# Altium schematic symbol library jlcpcb_2025_04_resistors_extended_1210.schlib: 2670 symbols (part 9 of 14) (continued)
## ESR25JZPF82R0 (continued)
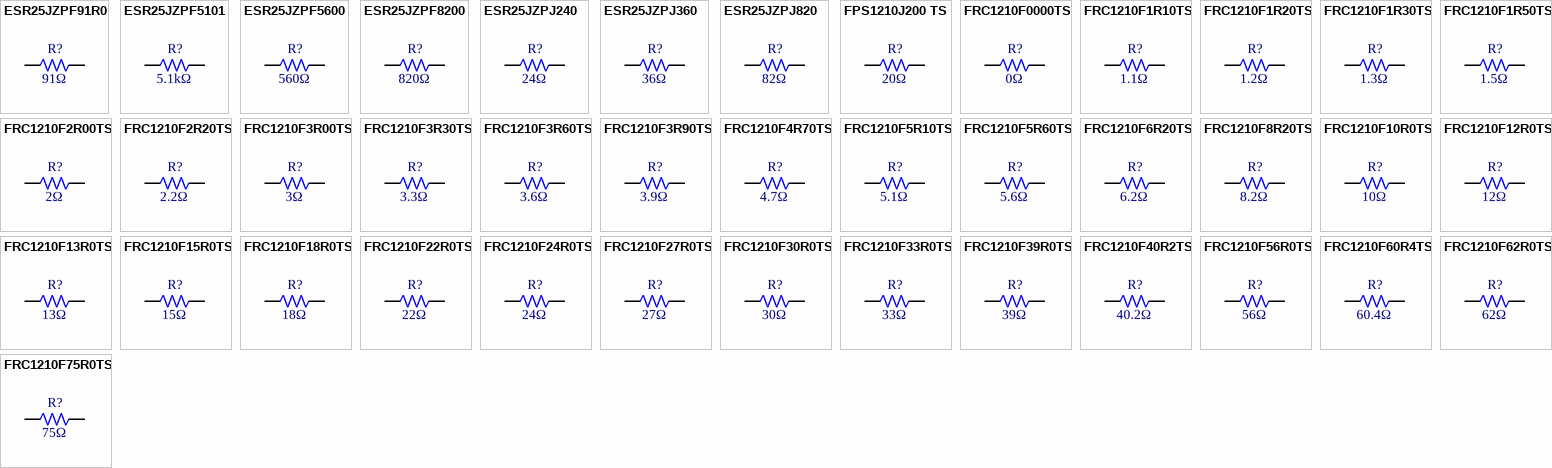
[diagram p40: symbols ESR25JZPF91R0 to FRC1210F75R0TS]

## ESR25JZPF91R0
designator R?  Resistance: 91Ω  (hidden comment: *)
Resistor, 91Ω, ±1%, 660mW, 200V, ±100ppm/℃, -55℃~+155℃, SMD 1210; Manufacturer: Uniroyal; Manufacturer Part Number: ESR25JZPF91R0; Supplier 1: LCSC; Supplier Part Number 1: C307931; JLCPCB Part Number: C307931; Power Rating: 660mW; Category: Resistors; Package Size: 1210; JLCPCB Basic Part: Yes; Tolerance: ±1%; Voltage Rating: 200V; Temperature Coefficient: ±100ppm/℃; Temperature Rating: -55℃~+155℃; ComponentLink1Description: Datasheet; ComponentLink1URL: https://wmsc.lcsc.com/wmsc/upload/file/pdf/v2/lcsc/1810171830_ROHM-Semicon-ESR25JZPF91R0_C307931.pdf; ComponentLink2Description: JLCPCB Part URL; ComponentLink2URL: https://jlcpcb.com/partdetail/C307931
pins: 1, 2
1 alternate drawing of the same symbol

## ESR25JZPF5101
designator R?  Resistance: 5.1kΩ  (hidden comment: *)
Resistor, 5.1kΩ, ±1%, 660mW, 200V, ±100ppm/℃, -55℃~+155℃, SMD 1210; Manufacturer: Uniroyal; Manufacturer Part Number: ESR25JZPF5101; Supplier 1: LCSC; Supplier Part Number 1: C307928; JLCPCB Part Number: C307928; Power Rating: 660mW; Category: Resistors; Package Size: 1210; JLCPCB Basic Part: Yes; Tolerance: ±1%; Voltage Rating: 200V; Temperature Coefficient: ±100ppm/℃; Temperature Rating: -55℃~+155℃; ComponentLink1Description: Datasheet; ComponentLink1URL: https://wmsc.lcsc.com/wmsc/upload/file/pdf/v2/lcsc/1811021935_ROHM-Semicon-ESR25JZPF5101_C307928.pdf; ComponentLink2Description: JLCPCB Part URL; ComponentLink2URL: https://jlcpcb.com/partdetail/C307928
pins: 1, 2
1 alternate drawing of the same symbol

## ESR25JZPF5600
designator R?  Resistance: 560Ω  (hidden comment: *)
Resistor, 560Ω, ±1%, 660mW, 200V, ±100ppm/℃, -55℃~+155℃, SMD 1210; Manufacturer: Uniroyal; Manufacturer Part Number: ESR25JZPF5600; Supplier 1: LCSC; Supplier Part Number 1: C307929; JLCPCB Part Number: C307929; Power Rating: 660mW; Category: Resistors; Package Size: 1210; JLCPCB Basic Part: Yes; Tolerance: ±1%; Voltage Rating: 200V; Temperature Coefficient: ±100ppm/℃; Temperature Rating: -55℃~+155℃; ComponentLink1Description: Datasheet; ComponentLink1URL: https://wmsc.lcsc.com/wmsc/upload/file/pdf/v2/lcsc/1811061027_ROHM-Semicon-ESR25JZPF5600_C307929.pdf; ComponentLink2Description: JLCPCB Part URL; ComponentLink2URL: https://jlcpcb.com/partdetail/C307929
pins: 1, 2
1 alternate drawing of the same symbol

## ESR25JZPF8200
designator R?  Resistance: 820Ω  (hidden comment: *)
Resistor, 820Ω, ±1%, 660mW, 200V, ±100ppm/℃, -55℃~+155℃, SMD 1210; Manufacturer: Uniroyal; Manufacturer Part Number: ESR25JZPF8200; Supplier 1: LCSC; Supplier Part Number 1: C307930; JLCPCB Part Number: C307930; Power Rating: 660mW; Category: Resistors; Package Size: 1210; JLCPCB Basic Part: Yes; Tolerance: ±1%; Voltage Rating: 200V; Temperature Coefficient: ±100ppm/℃; Temperature Rating: -55℃~+155℃; ComponentLink1Description: Datasheet; ComponentLink1URL: https://wmsc.lcsc.com/wmsc/upload/file/pdf/v2/lcsc/1811141835_ROHM-Semicon-ESR25JZPF8200_C307930.pdf; ComponentLink2Description: JLCPCB Part URL; ComponentLink2URL: https://jlcpcb.com/partdetail/C307930
pins: 1, 2
1 alternate drawing of the same symbol

## ESR25JZPJ240
designator R?  Resistance: 24Ω  (hidden comment: *)
Resistor, 24Ω, ±5%, 666.667mW, 200V, ±200ppm/℃, -55℃~+155℃, SMD 1210; Manufacturer: Uniroyal; Manufacturer Part Number: ESR25JZPJ240; Supplier 1: LCSC; Supplier Part Number 1: C307935; JLCPCB Part Number: C307935; Power Rating: 666.667mW; Category: Resistors; Package Size: 1210; JLCPCB Basic Part: Yes; Tolerance: ±5%; Voltage Rating: 200V; Temperature Coefficient: ±200ppm/℃; Temperature Rating: -55℃~+155℃; ComponentLink1Description: Datasheet; ComponentLink1URL: https://wmsc.lcsc.com/wmsc/upload/file/pdf/v2/lcsc/1912111437_ROHM-Semicon-ESR25JZPJ240_C307935.pdf; ComponentLink2Description: JLCPCB Part URL; ComponentLink2URL: https://jlcpcb.com/partdetail/C307935
pins: 1, 2
1 alternate drawing of the same symbol

## ESR25JZPJ360
designator R?  Resistance: 36Ω  (hidden comment: *)
Resistor, 36Ω, ±5%, 660mW, 200V, ±200ppm/℃, -55℃~+155℃, SMD 1210; Manufacturer: Uniroyal; Manufacturer Part Number: ESR25JZPJ360; Supplier 1: LCSC; Supplier Part Number 1: C307938; JLCPCB Part Number: C307938; Power Rating: 660mW; Category: Resistors; Package Size: 1210; JLCPCB Basic Part: Yes; Tolerance: ±5%; Voltage Rating: 200V; Temperature Coefficient: ±200ppm/℃; Temperature Rating: -55℃~+155℃; ComponentLink1Description: Datasheet; ComponentLink1URL: https://wmsc.lcsc.com/wmsc/upload/file/pdf/v2/lcsc/1912111437_ROHM-Semicon-ESR25JZPJ360_C307938.pdf; ComponentLink2Description: JLCPCB Part URL; ComponentLink2URL: https://jlcpcb.com/partdetail/C307938
pins: 1, 2
1 alternate drawing of the same symbol

## ESR25JZPJ820
designator R?  Resistance: 82Ω  (hidden comment: *)
Resistor, 82Ω, ±5%, 660mW, 200V, ±200ppm/℃, -55℃~+155℃, SMD 1210; Manufacturer: Uniroyal; Manufacturer Part Number: ESR25JZPJ820; Supplier 1: LCSC; Supplier Part Number 1: C307941; JLCPCB Part Number: C307941; Power Rating: 660mW; Category: Resistors; Package Size: 1210; JLCPCB Basic Part: Yes; Tolerance: ±5%; Voltage Rating: 200V; Temperature Coefficient: ±200ppm/℃; Temperature Rating: -55℃~+155℃; ComponentLink1Description: Datasheet; ComponentLink1URL: https://wmsc.lcsc.com/wmsc/upload/file/pdf/v2/lcsc/1912111437_ROHM-Semicon-ESR25JZPJ820_C307941.pdf; ComponentLink2Description: JLCPCB Part URL; ComponentLink2URL: https://jlcpcb.com/partdetail/C307941
pins: 1, 2
1 alternate drawing of the same symbol

## FPS1210J200 TS
designator R?  Resistance: 20Ω  (hidden comment: *)
Resistor, 20Ω, ±5%, ±200ppm/℃, SMD 1210; Manufacturer: Uniroyal; Manufacturer Part Number: FPS1210J200 TS; Supplier 1: LCSC; Supplier Part Number 1: C3013392; JLCPCB Part Number: C3013392; Category: Resistors; Package Size: 1210; JLCPCB Basic Part: Yes; Tolerance: ±5%; Temperature Coefficient: ±200ppm/℃; ComponentLink1Description: Datasheet; ComponentLink1URL: https://wmsc.lcsc.com/wmsc/upload/file/pdf/v2/lcsc/2308241947_FOJAN-FPS1210J200-TS_C3013392.pdf; ComponentLink2Description: JLCPCB Part URL; ComponentLink2URL: https://jlcpcb.com/partdetail/C3013392
pins: 1, 2
1 alternate drawing of the same symbol

## FRC1210F0000TS
designator R?  Resistance: 0Ω  (hidden comment: *)
Resistor, 0Ω, ±1%, 333.333mW, 200V, ±200ppm/℃, -55℃~+155℃, SMD 1210; Manufacturer: Uniroyal; Manufacturer Part Number: FRC1210F0000TS; Supplier 1: LCSC; Supplier Part Number 1: C2974058; JLCPCB Part Number: C2974058; Power Rating: 333.333mW; Category: Resistors; Package Size: 1210; JLCPCB Basic Part: Yes; Tolerance: ±1%; Voltage Rating: 200V; Temperature Coefficient: ±200ppm/℃; Temperature Rating: -55℃~+155℃; ComponentLink1Description: Datasheet; ComponentLink1URL: https://wmsc.lcsc.com/wmsc/upload/file/pdf/v2/lcsc/2202151130_FOJAN-FRC1210F0000TS_C2974058.pdf; ComponentLink2Description: JLCPCB Part URL; ComponentLink2URL: https://jlcpcb.com/partdetail/C2974058
pins: 1, 2
1 alternate drawing of the same symbol

## FRC1210F1R10TS
designator R?  Resistance: 1.1Ω  (hidden comment: *)
Resistor, 1.1Ω, ±1%, 333.333mW, 200V, ±200ppm/℃, -55℃~+155℃, SMD 1210; Manufacturer: Uniroyal; Manufacturer Part Number: FRC1210F1R10TS; Supplier 1: LCSC; Supplier Part Number 1: C2933808; JLCPCB Part Number: C2933808; Power Rating: 333.333mW; Category: Resistors; Package Size: 1210; JLCPCB Basic Part: Yes; Tolerance: ±1%; Voltage Rating: 200V; Temperature Coefficient: ±200ppm/℃; Temperature Rating: -55℃~+155℃; ComponentLink1Description: Datasheet; ComponentLink1URL: https://wmsc.lcsc.com/wmsc/upload/file/pdf/v2/lcsc/2308241115_FOJAN-FRC1210F1R10TS_C2933808.pdf; ComponentLink2Description: JLCPCB Part URL; ComponentLink2URL: https://jlcpcb.com/partdetail/C2933808
pins: 1, 2
1 alternate drawing of the same symbol

## FRC1210F1R20TS
designator R?  Resistance: 1.2Ω  (hidden comment: *)
Resistor, 1.2Ω, ±1%, 333.333mW, 200V, ±200ppm/℃, -55℃~+155℃, SMD 1210; Manufacturer: Uniroyal; Manufacturer Part Number: FRC1210F1R20TS; Supplier 1: LCSC; Supplier Part Number 1: C2933809; JLCPCB Part Number: C2933809; Power Rating: 333.333mW; Category: Resistors; Package Size: 1210; JLCPCB Basic Part: Yes; Tolerance: ±1%; Voltage Rating: 200V; Temperature Coefficient: ±200ppm/℃; Temperature Rating: -55℃~+155℃; ComponentLink1Description: Datasheet; ComponentLink1URL: https://wmsc.lcsc.com/wmsc/upload/file/pdf/v2/lcsc/2308241115_FOJAN-FRC1210F1R20TS_C2933809.pdf; ComponentLink2Description: JLCPCB Part URL; ComponentLink2URL: https://jlcpcb.com/partdetail/C2933809
pins: 1, 2
1 alternate drawing of the same symbol

## FRC1210F1R30TS
designator R?  Resistance: 1.3Ω  (hidden comment: *)
Resistor, 1.3Ω, ±1%, 333.333mW, 200V, ±200ppm/℃, -55℃~+155℃, SMD 1210; Manufacturer: Uniroyal; Manufacturer Part Number: FRC1210F1R30TS; Supplier 1: LCSC; Supplier Part Number 1: C2960823; JLCPCB Part Number: C2960823; Power Rating: 333.333mW; Category: Resistors; Package Size: 1210; JLCPCB Basic Part: Yes; Tolerance: ±1%; Voltage Rating: 200V; Temperature Coefficient: ±200ppm/℃; Temperature Rating: -55℃~+155℃; ComponentLink1Description: Datasheet; ComponentLink1URL: https://wmsc.lcsc.com/wmsc/upload/file/pdf/v2/lcsc/2308241947_FOJAN-FRC1210F1R30TS_C2960823.pdf; ComponentLink2Description: JLCPCB Part URL; ComponentLink2URL: https://jlcpcb.com/partdetail/C2960823
pins: 1, 2
1 alternate drawing of the same symbol

## FRC1210F1R50TS
designator R?  Resistance: 1.5Ω  (hidden comment: *)
Resistor, 1.5Ω, ±1%, 500mW, 200V, ±200ppm/℃, -55℃~+155℃, SMD 1210; Manufacturer: Uniroyal; Manufacturer Part Number: FRC1210F1R50TS; Supplier 1: LCSC; Supplier Part Number 1: C2960845; JLCPCB Part Number: C2960845; Power Rating: 500mW; Category: Resistors; Package Size: 1210; JLCPCB Basic Part: Yes; Tolerance: ±1%; Voltage Rating: 200V; Temperature Coefficient: ±200ppm/℃; Temperature Rating: -55℃~+155℃; ComponentLink1Description: Datasheet; ComponentLink1URL: https://wmsc.lcsc.com/wmsc/upload/file/pdf/v2/lcsc/2308241947_FOJAN-FRC1210F1R50TS_C2960845.pdf; ComponentLink2Description: JLCPCB Part URL; ComponentLink2URL: https://jlcpcb.com/partdetail/C2960845
pins: 1, 2
1 alternate drawing of the same symbol

## FRC1210F2R00TS
designator R?  Resistance: 2Ω  (hidden comment: *)
Resistor, 2Ω, ±1%, 333.333mW, 200V, SMD 1210; Manufacturer: Uniroyal; Manufacturer Part Number: FRC1210F2R00TS; Supplier 1: LCSC; Supplier Part Number 1: C2999610; JLCPCB Part Number: C2999610; Power Rating: 333.333mW; Category: Resistors; Package Size: 1210; JLCPCB Basic Part: Yes; Tolerance: ±1%; Voltage Rating: 200V; ComponentLink1Description: Datasheet; ComponentLink1URL: https://wmsc.lcsc.com/wmsc/upload/file/pdf/v2/lcsc/2308241947_FOJAN-FRC1210F2R00TS_C2999610.pdf; ComponentLink2Description: JLCPCB Part URL; ComponentLink2URL: https://jlcpcb.com/partdetail/C2999610
pins: 1, 2
1 alternate drawing of the same symbol

## FRC1210F2R20TS
designator R?  Resistance: 2.2Ω  (hidden comment: *)
Resistor, 2.2Ω, ±1%, 333.333mW, 200V, ±200ppm/℃, SMD 1210; Manufacturer: Uniroyal; Manufacturer Part Number: FRC1210F2R20TS; Supplier 1: LCSC; Supplier Part Number 1: C3013277; JLCPCB Part Number: C3013277; Power Rating: 333.333mW; Category: Resistors; Package Size: 1210; JLCPCB Basic Part: Yes; Tolerance: ±1%; Voltage Rating: 200V; Temperature Coefficient: ±200ppm/℃; ComponentLink1Description: Datasheet; ComponentLink1URL: https://wmsc.lcsc.com/wmsc/upload/file/pdf/v2/lcsc/2308241947_FOJAN-FRC1210F2R20TS_C3013277.pdf; ComponentLink2Description: JLCPCB Part URL; ComponentLink2URL: https://jlcpcb.com/partdetail/C3013277
pins: 1, 2
1 alternate drawing of the same symbol

## FRC1210F3R00TS
designator R?  Resistance: 3Ω  (hidden comment: *)
Resistor, 3Ω, ±1%, 333.333mW, 200V, ±200ppm/℃, SMD 1210; Manufacturer: Uniroyal; Manufacturer Part Number: FRC1210F3R00TS; Supplier 1: LCSC; Supplier Part Number 1: C2999570; JLCPCB Part Number: C2999570; Power Rating: 333.333mW; Category: Resistors; Package Size: 1210; JLCPCB Basic Part: Yes; Tolerance: ±1%; Voltage Rating: 200V; Temperature Coefficient: ±200ppm/℃; ComponentLink1Description: Datasheet; ComponentLink1URL: https://wmsc.lcsc.com/wmsc/upload/file/pdf/v2/lcsc/2308241947_FOJAN-FRC1210F3R00TS_C2999570.pdf; ComponentLink2Description: JLCPCB Part URL; ComponentLink2URL: https://jlcpcb.com/partdetail/C2999570
pins: 1, 2
1 alternate drawing of the same symbol

## FRC1210F3R30TS
designator R?  Resistance: 3.3Ω  (hidden comment: *)
Resistor, 3.3Ω, ±1%, 333.333mW, 200V, ±200ppm/℃, SMD 1210; Manufacturer: Uniroyal; Manufacturer Part Number: FRC1210F3R30TS; Supplier 1: LCSC; Supplier Part Number 1: C2999568; JLCPCB Part Number: C2999568; Power Rating: 333.333mW; Category: Resistors; Package Size: 1210; JLCPCB Basic Part: Yes; Tolerance: ±1%; Voltage Rating: 200V; Temperature Coefficient: ±200ppm/℃; ComponentLink1Description: Datasheet; ComponentLink1URL: https://wmsc.lcsc.com/wmsc/upload/file/pdf/v2/lcsc/2308241947_FOJAN-FRC1210F3R30TS_C2999568.pdf; ComponentLink2Description: JLCPCB Part URL; ComponentLink2URL: https://jlcpcb.com/partdetail/C2999568
pins: 1, 2
1 alternate drawing of the same symbol

## FRC1210F3R60TS
designator R?  Resistance: 3.6Ω  (hidden comment: *)
Resistor, 3.6Ω, ±1%, 333.333mW, 200V, ±200ppm/℃, -55℃~+155℃, SMD 1210; Manufacturer: Uniroyal; Manufacturer Part Number: FRC1210F3R60TS; Supplier 1: LCSC; Supplier Part Number 1: C2933820; JLCPCB Part Number: C2933820; Power Rating: 333.333mW; Category: Resistors; Package Size: 1210; JLCPCB Basic Part: Yes; Tolerance: ±1%; Voltage Rating: 200V; Temperature Coefficient: ±200ppm/℃; Temperature Rating: -55℃~+155℃; ComponentLink1Description: Datasheet; ComponentLink1URL: https://wmsc.lcsc.com/wmsc/upload/file/pdf/v2/lcsc/2308241115_FOJAN-FRC1210F3R60TS_C2933820.pdf; ComponentLink2Description: JLCPCB Part URL; ComponentLink2URL: https://jlcpcb.com/partdetail/C2933820
pins: 1, 2
1 alternate drawing of the same symbol

## FRC1210F3R90TS
designator R?  Resistance: 3.9Ω  (hidden comment: *)
Resistor, 3.9Ω, ±1%, 333.333mW, 200V, ±200ppm/℃, SMD 1210; Manufacturer: Uniroyal; Manufacturer Part Number: FRC1210F3R90TS; Supplier 1: LCSC; Supplier Part Number 1: C3000655; JLCPCB Part Number: C3000655; Power Rating: 333.333mW; Category: Resistors; Package Size: 1210; JLCPCB Basic Part: Yes; Tolerance: ±1%; Voltage Rating: 200V; Temperature Coefficient: ±200ppm/℃; ComponentLink1Description: Datasheet; ComponentLink1URL: https://wmsc.lcsc.com/wmsc/upload/file/pdf/v2/lcsc/2308241947_FOJAN-FRC1210F3R90TS_C3000655.pdf; ComponentLink2Description: JLCPCB Part URL; ComponentLink2URL: https://jlcpcb.com/partdetail/C3000655
pins: 1, 2
1 alternate drawing of the same symbol

## FRC1210F4R70TS
designator R?  Resistance: 4.7Ω  (hidden comment: *)
Resistor, 4.7Ω, ±1%, 333.333mW, 200V, ±200ppm/℃, SMD 1210; Manufacturer: Uniroyal; Manufacturer Part Number: FRC1210F4R70TS; Supplier 1: LCSC; Supplier Part Number 1: C2999571; JLCPCB Part Number: C2999571; Power Rating: 333.333mW; Category: Resistors; Package Size: 1210; JLCPCB Basic Part: Yes; Tolerance: ±1%; Voltage Rating: 200V; Temperature Coefficient: ±200ppm/℃; ComponentLink1Description: Datasheet; ComponentLink1URL: https://wmsc.lcsc.com/wmsc/upload/file/pdf/v2/lcsc/2308241947_FOJAN-FRC1210F4R70TS_C2999571.pdf; ComponentLink2Description: JLCPCB Part URL; ComponentLink2URL: https://jlcpcb.com/partdetail/C2999571
pins: 1, 2
1 alternate drawing of the same symbol

## FRC1210F5R10TS
designator R?  Resistance: 5.1Ω  (hidden comment: *)
Resistor, 5.1Ω, ±1%, 333.333mW, 200V, ±200ppm/℃, -55℃~+155℃, SMD 1210; Manufacturer: Uniroyal; Manufacturer Part Number: FRC1210F5R10TS; Supplier 1: LCSC; Supplier Part Number 1: C2933823; JLCPCB Part Number: C2933823; Power Rating: 333.333mW; Category: Resistors; Package Size: 1210; JLCPCB Basic Part: Yes; Tolerance: ±1%; Voltage Rating: 200V; Temperature Coefficient: ±200ppm/℃; Temperature Rating: -55℃~+155℃; ComponentLink1Description: Datasheet; ComponentLink1URL: https://wmsc.lcsc.com/wmsc/upload/file/pdf/v2/lcsc/2308241115_FOJAN-FRC1210F5R10TS_C2933823.pdf; ComponentLink2Description: JLCPCB Part URL; ComponentLink2URL: https://jlcpcb.com/partdetail/C2933823
pins: 1, 2
1 alternate drawing of the same symbol

## FRC1210F5R60TS
designator R?  Resistance: 5.6Ω  (hidden comment: *)
Resistor, 5.6Ω, ±1%, 333.333mW, 200V, ±200ppm/℃, SMD 1210; Manufacturer: Uniroyal; Manufacturer Part Number: FRC1210F5R60TS; Supplier 1: LCSC; Supplier Part Number 1: C3013282; JLCPCB Part Number: C3013282; Power Rating: 333.333mW; Category: Resistors; Package Size: 1210; JLCPCB Basic Part: Yes; Tolerance: ±1%; Voltage Rating: 200V; Temperature Coefficient: ±200ppm/℃; ComponentLink1Description: Datasheet; ComponentLink1URL: https://wmsc.lcsc.com/wmsc/upload/file/pdf/v2/lcsc/2308241947_FOJAN-FRC1210F5R60TS_C3013282.pdf; ComponentLink2Description: JLCPCB Part URL; ComponentLink2URL: https://jlcpcb.com/partdetail/C3013282
pins: 1, 2
1 alternate drawing of the same symbol

## FRC1210F6R20TS
designator R?  Resistance: 6.2Ω  (hidden comment: *)
Resistor, 6.2Ω, ±1%, 333.333mW, 200V, ±200ppm/℃, SMD 1210; Manufacturer: Uniroyal; Manufacturer Part Number: FRC1210F6R20TS; Supplier 1: LCSC; Supplier Part Number 1: C2999575; JLCPCB Part Number: C2999575; Power Rating: 333.333mW; Category: Resistors; Package Size: 1210; JLCPCB Basic Part: Yes; Tolerance: ±1%; Voltage Rating: 200V; Temperature Coefficient: ±200ppm/℃; ComponentLink1Description: Datasheet; ComponentLink1URL: https://wmsc.lcsc.com/wmsc/upload/file/pdf/v2/lcsc/2308241947_FOJAN-FRC1210F6R20TS_C2999575.pdf; ComponentLink2Description: JLCPCB Part URL; ComponentLink2URL: https://jlcpcb.com/partdetail/C2999575
pins: 1, 2
1 alternate drawing of the same symbol

## FRC1210F8R20TS
designator R?  Resistance: 8.2Ω  (hidden comment: *)
Resistor, 8.2Ω, ±1%, 333.333mW, 200V, ±200ppm/℃, -55℃~+155℃, SMD 1210; Manufacturer: Uniroyal; Manufacturer Part Number: FRC1210F8R20TS; Supplier 1: LCSC; Supplier Part Number 1: C2933825; JLCPCB Part Number: C2933825; Power Rating: 333.333mW; Category: Resistors; Package Size: 1210; JLCPCB Basic Part: Yes; Tolerance: ±1%; Voltage Rating: 200V; Temperature Coefficient: ±200ppm/℃; Temperature Rating: -55℃~+155℃; ComponentLink1Description: Datasheet; ComponentLink1URL: https://wmsc.lcsc.com/wmsc/upload/file/pdf/v2/lcsc/2308241115_FOJAN-FRC1210F8R20TS_C2933825.pdf; ComponentLink2Description: JLCPCB Part URL; ComponentLink2URL: https://jlcpcb.com/partdetail/C2933825
pins: 1, 2
1 alternate drawing of the same symbol

## FRC1210F10R0TS
designator R?  Resistance: 10Ω  (hidden comment: *)
Resistor, 10Ω, ±1%, 333.333mW, 200V, ±200ppm/℃, -55℃~+155℃, SMD 1210; Manufacturer: Uniroyal; Manufacturer Part Number: FRC1210F10R0TS; Supplier 1: LCSC; Supplier Part Number 1: C2974060; JLCPCB Part Number: C2974060; Power Rating: 333.333mW; Category: Resistors; Package Size: 1210; JLCPCB Basic Part: Yes; Tolerance: ±1%; Voltage Rating: 200V; Temperature Coefficient: ±200ppm/℃; Temperature Rating: -55℃~+155℃; ComponentLink1Description: Datasheet; ComponentLink1URL: https://wmsc.lcsc.com/wmsc/upload/file/pdf/v2/lcsc/2202151130_FOJAN-FRC1210F10R0TS_C2974060.pdf; ComponentLink2Description: JLCPCB Part URL; ComponentLink2URL: https://jlcpcb.com/partdetail/C2974060
pins: 1, 2
1 alternate drawing of the same symbol

## FRC1210F12R0TS
designator R?  Resistance: 12Ω  (hidden comment: *)
Resistor, 12Ω, ±1%, 333.333mW, 200V, ±100ppm/℃, -55℃~+155℃, SMD 1210; Manufacturer: Uniroyal; Manufacturer Part Number: FRC1210F12R0TS; Supplier 1: LCSC; Supplier Part Number 1: C2933802; JLCPCB Part Number: C2933802; Power Rating: 333.333mW; Category: Resistors; Package Size: 1210; JLCPCB Basic Part: Yes; Tolerance: ±1%; Voltage Rating: 200V; Temperature Coefficient: ±100ppm/℃; Temperature Rating: -55℃~+155℃; ComponentLink1Description: Datasheet; ComponentLink1URL: https://wmsc.lcsc.com/wmsc/upload/file/pdf/v2/lcsc/2308241115_FOJAN-FRC1210F12R0TS_C2933802.pdf; ComponentLink2Description: JLCPCB Part URL; ComponentLink2URL: https://jlcpcb.com/partdetail/C2933802
pins: 1, 2
1 alternate drawing of the same symbol

## FRC1210F13R0TS
designator R?  Resistance: 13Ω  (hidden comment: *)
Resistor, 13Ω, ±1%, 333.333mW, 200V, ±100ppm/℃, -55℃~+155℃, SMD 1210; Manufacturer: Uniroyal; Manufacturer Part Number: FRC1210F13R0TS; Supplier 1: LCSC; Supplier Part Number 1: C2933803; JLCPCB Part Number: C2933803; Power Rating: 333.333mW; Category: Resistors; Package Size: 1210; JLCPCB Basic Part: Yes; Tolerance: ±1%; Voltage Rating: 200V; Temperature Coefficient: ±100ppm/℃; Temperature Rating: -55℃~+155℃; ComponentLink1Description: Datasheet; ComponentLink1URL: https://wmsc.lcsc.com/wmsc/upload/file/pdf/v2/lcsc/2308241115_FOJAN-FRC1210F13R0TS_C2933803.pdf; ComponentLink2Description: JLCPCB Part URL; ComponentLink2URL: https://jlcpcb.com/partdetail/C2933803
pins: 1, 2
1 alternate drawing of the same symbol

## FRC1210F15R0TS
designator R?  Resistance: 15Ω  (hidden comment: *)
Resistor, 15Ω, ±1%, 333.333mW, 200V, ±100ppm/℃, -55℃~+155℃, SMD 1210; Manufacturer: Uniroyal; Manufacturer Part Number: FRC1210F15R0TS; Supplier 1: LCSC; Supplier Part Number 1: C2960857; JLCPCB Part Number: C2960857; Power Rating: 333.333mW; Category: Resistors; Package Size: 1210; JLCPCB Basic Part: Yes; Tolerance: ±1%; Voltage Rating: 200V; Temperature Coefficient: ±100ppm/℃; Temperature Rating: -55℃~+155℃; ComponentLink1Description: Datasheet; ComponentLink1URL: https://wmsc.lcsc.com/wmsc/upload/file/pdf/v2/lcsc/2308241947_FOJAN-FRC1210F15R0TS_C2960857.pdf; ComponentLink2Description: JLCPCB Part URL; ComponentLink2URL: https://jlcpcb.com/partdetail/C2960857
pins: 1, 2
1 alternate drawing of the same symbol

## FRC1210F18R0TS
designator R?  Resistance: 18Ω  (hidden comment: *)
Resistor, 18Ω, ±1%, 333.333mW, 200V, ±100ppm/℃, -55℃~+155℃, SMD 1210; Manufacturer: Uniroyal; Manufacturer Part Number: FRC1210F18R0TS; Supplier 1: LCSC; Supplier Part Number 1: C2933807; JLCPCB Part Number: C2933807; Power Rating: 333.333mW; Category: Resistors; Package Size: 1210; JLCPCB Basic Part: Yes; Tolerance: ±1%; Voltage Rating: 200V; Temperature Coefficient: ±100ppm/℃; Temperature Rating: -55℃~+155℃; ComponentLink1Description: Datasheet; ComponentLink1URL: https://wmsc.lcsc.com/wmsc/upload/file/pdf/v2/lcsc/2308241115_FOJAN-FRC1210F18R0TS_C2933807.pdf; ComponentLink2Description: JLCPCB Part URL; ComponentLink2URL: https://jlcpcb.com/partdetail/C2933807
pins: 1, 2
1 alternate drawing of the same symbol

## FRC1210F22R0TS
designator R?  Resistance: 22Ω  (hidden comment: *)
Resistor, 22Ω, ±1%, 333.333mW, 200V, ±100ppm/℃, -55℃~+155℃, SMD 1210; Manufacturer: Uniroyal; Manufacturer Part Number: FRC1210F22R0TS; Supplier 1: LCSC; Supplier Part Number 1: C2960863; JLCPCB Part Number: C2960863; Power Rating: 333.333mW; Category: Resistors; Package Size: 1210; JLCPCB Basic Part: Yes; Tolerance: ±1%; Voltage Rating: 200V; Temperature Coefficient: ±100ppm/℃; Temperature Rating: -55℃~+155℃; ComponentLink1Description: Datasheet; ComponentLink1URL: https://wmsc.lcsc.com/wmsc/upload/file/pdf/v2/lcsc/2308241947_FOJAN-FRC1210F22R0TS_C2960863.pdf; ComponentLink2Description: JLCPCB Part URL; ComponentLink2URL: https://jlcpcb.com/partdetail/C2960863
pins: 1, 2
1 alternate drawing of the same symbol

## FRC1210F24R0TS
designator R?  Resistance: 24Ω  (hidden comment: *)
Resistor, 24Ω, ±1%, 333.333mW, 200V, ±100ppm/℃, -55℃~+155℃, SMD 1210; Manufacturer: Uniroyal; Manufacturer Part Number: FRC1210F24R0TS; Supplier 1: LCSC; Supplier Part Number 1: C2933815; JLCPCB Part Number: C2933815; Power Rating: 333.333mW; Category: Resistors; Package Size: 1210; JLCPCB Basic Part: Yes; Tolerance: ±1%; Voltage Rating: 200V; Temperature Coefficient: ±100ppm/℃; Temperature Rating: -55℃~+155℃; ComponentLink1Description: Datasheet; ComponentLink1URL: https://wmsc.lcsc.com/wmsc/upload/file/pdf/v2/lcsc/2308241115_FOJAN-FRC1210F24R0TS_C2933815.pdf; ComponentLink2Description: JLCPCB Part URL; ComponentLink2URL: https://jlcpcb.com/partdetail/C2933815
pins: 1, 2
1 alternate drawing of the same symbol

## FRC1210F27R0TS
designator R?  Resistance: 27Ω  (hidden comment: *)
Resistor, 27Ω, ±1%, 333.333mW, 200V, ±100ppm/℃, -55℃~+155℃, SMD 1210; Manufacturer: Uniroyal; Manufacturer Part Number: FRC1210F27R0TS; Supplier 1: LCSC; Supplier Part Number 1: C2960734; JLCPCB Part Number: C2960734; Power Rating: 333.333mW; Category: Resistors; Package Size: 1210; JLCPCB Basic Part: Yes; Tolerance: ±1%; Voltage Rating: 200V; Temperature Coefficient: ±100ppm/℃; Temperature Rating: -55℃~+155℃; ComponentLink1Description: Datasheet; ComponentLink1URL: https://wmsc.lcsc.com/wmsc/upload/file/pdf/v2/lcsc/2308241947_FOJAN-FRC1210F27R0TS_C2960734.pdf; ComponentLink2Description: JLCPCB Part URL; ComponentLink2URL: https://jlcpcb.com/partdetail/C2960734
pins: 1, 2
1 alternate drawing of the same symbol

## FRC1210F30R0TS
designator R?  Resistance: 30Ω  (hidden comment: *)
Resistor, 30Ω, ±1%, 333.333mW, 200V, ±100ppm/℃, SMD 1210; Manufacturer: Uniroyal; Manufacturer Part Number: FRC1210F30R0TS; Supplier 1: LCSC; Supplier Part Number 1: C2999612; JLCPCB Part Number: C2999612; Power Rating: 333.333mW; Category: Resistors; Package Size: 1210; JLCPCB Basic Part: Yes; Tolerance: ±1%; Voltage Rating: 200V; Temperature Coefficient: ±100ppm/℃; ComponentLink1Description: Datasheet; ComponentLink1URL: https://wmsc.lcsc.com/wmsc/upload/file/pdf/v2/lcsc/2308241947_FOJAN-FRC1210F30R0TS_C2999612.pdf; ComponentLink2Description: JLCPCB Part URL; ComponentLink2URL: https://jlcpcb.com/partdetail/C2999612
pins: 1, 2
1 alternate drawing of the same symbol

## FRC1210F33R0TS
designator R?  Resistance: 33Ω  (hidden comment: *)
Resistor, 33Ω, ±1%, 500mW, 200V, ±100ppm/℃, -55℃~+155℃, SMD 1210; Manufacturer: Uniroyal; Manufacturer Part Number: FRC1210F33R0TS; Supplier 1: LCSC; Supplier Part Number 1: C2933819; JLCPCB Part Number: C2933819; Power Rating: 500mW; Category: Resistors; Package Size: 1210; JLCPCB Basic Part: Yes; Tolerance: ±1%; Voltage Rating: 200V; Temperature Coefficient: ±100ppm/℃; Temperature Rating: -55℃~+155℃; ComponentLink1Description: Datasheet; ComponentLink1URL: https://wmsc.lcsc.com/wmsc/upload/file/pdf/v2/lcsc/2308241115_FOJAN-FRC1210F33R0TS_C2933819.pdf; ComponentLink2Description: JLCPCB Part URL; ComponentLink2URL: https://jlcpcb.com/partdetail/C2933819
pins: 1, 2
1 alternate drawing of the same symbol

## FRC1210F39R0TS
designator R?  Resistance: 39Ω  (hidden comment: *)
Resistor, 39Ω, ±1%, 333.333mW, 200V, ±100ppm/℃, SMD 1210; Manufacturer: Uniroyal; Manufacturer Part Number: FRC1210F39R0TS; Supplier 1: LCSC; Supplier Part Number 1: C2999580; JLCPCB Part Number: C2999580; Power Rating: 333.333mW; Category: Resistors; Package Size: 1210; JLCPCB Basic Part: Yes; Tolerance: ±1%; Voltage Rating: 200V; Temperature Coefficient: ±100ppm/℃; ComponentLink1Description: Datasheet; ComponentLink1URL: https://wmsc.lcsc.com/wmsc/upload/file/pdf/v2/lcsc/2308241947_FOJAN-FRC1210F39R0TS_C2999580.pdf; ComponentLink2Description: JLCPCB Part URL; ComponentLink2URL: https://jlcpcb.com/partdetail/C2999580
pins: 1, 2
1 alternate drawing of the same symbol

## FRC1210F40R2TS
designator R?  Resistance: 40.2Ω  (hidden comment: *)
Resistor, 40.2Ω, ±1%, 333.333mW, 200V, ±100ppm/℃, SMD 1210; Manufacturer: Uniroyal; Manufacturer Part Number: FRC1210F40R2TS; Supplier 1: LCSC; Supplier Part Number 1: C2999572; JLCPCB Part Number: C2999572; Power Rating: 333.333mW; Category: Resistors; Package Size: 1210; JLCPCB Basic Part: Yes; Tolerance: ±1%; Voltage Rating: 200V; Temperature Coefficient: ±100ppm/℃; ComponentLink1Description: Datasheet; ComponentLink1URL: https://wmsc.lcsc.com/wmsc/upload/file/pdf/v2/lcsc/2308241947_FOJAN-FRC1210F40R2TS_C2999572.pdf; ComponentLink2Description: JLCPCB Part URL; ComponentLink2URL: https://jlcpcb.com/partdetail/C2999572
pins: 1, 2
1 alternate drawing of the same symbol

## FRC1210F56R0TS
designator R?  Resistance: 56Ω  (hidden comment: *)
Resistor, 56Ω, ±1%, 333.333mW, 200V, ±100ppm/℃, SMD 1210; Manufacturer: Uniroyal; Manufacturer Part Number: FRC1210F56R0TS; Supplier 1: LCSC; Supplier Part Number 1: C2999507; JLCPCB Part Number: C2999507; Power Rating: 333.333mW; Category: Resistors; Package Size: 1210; JLCPCB Basic Part: Yes; Tolerance: ±1%; Voltage Rating: 200V; Temperature Coefficient: ±100ppm/℃; ComponentLink1Description: Datasheet; ComponentLink1URL: https://wmsc.lcsc.com/wmsc/upload/file/pdf/v2/lcsc/2308241947_FOJAN-FRC1210F56R0TS_C2999507.pdf; ComponentLink2Description: JLCPCB Part URL; ComponentLink2URL: https://jlcpcb.com/partdetail/C2999507
pins: 1, 2
1 alternate drawing of the same symbol

## FRC1210F60R4TS
designator R?  Resistance: 60.4Ω  (hidden comment: *)
Resistor, 60.4Ω, ±1%, 333.333mW, 200V, ±100ppm/℃, SMD 1210; Manufacturer: Uniroyal; Manufacturer Part Number: FRC1210F60R4TS; Supplier 1: LCSC; Supplier Part Number 1: C3000659; JLCPCB Part Number: C3000659; Power Rating: 333.333mW; Category: Resistors; Package Size: 1210; JLCPCB Basic Part: Yes; Tolerance: ±1%; Voltage Rating: 200V; Temperature Coefficient: ±100ppm/℃; ComponentLink1Description: Datasheet; ComponentLink1URL: https://wmsc.lcsc.com/wmsc/upload/file/pdf/v2/lcsc/2308241947_FOJAN-FRC1210F60R4TS_C3000659.pdf; ComponentLink2Description: JLCPCB Part URL; ComponentLink2URL: https://jlcpcb.com/partdetail/C3000659
pins: 1, 2
1 alternate drawing of the same symbol

## FRC1210F62R0TS
designator R?  Resistance: 62Ω  (hidden comment: *)
Resistor, 62Ω, ±1%, 333.333mW, 200V, ±100ppm/℃, SMD 1210; Manufacturer: Uniroyal; Manufacturer Part Number: FRC1210F62R0TS; Supplier 1: LCSC; Supplier Part Number 1: C2999513; JLCPCB Part Number: C2999513; Power Rating: 333.333mW; Category: Resistors; Package Size: 1210; JLCPCB Basic Part: Yes; Tolerance: ±1%; Voltage Rating: 200V; Temperature Coefficient: ±100ppm/℃; ComponentLink1Description: Datasheet; ComponentLink1URL: https://wmsc.lcsc.com/wmsc/upload/file/pdf/v2/lcsc/2308241947_FOJAN-FRC1210F62R0TS_C2999513.pdf; ComponentLink2Description: JLCPCB Part URL; ComponentLink2URL: https://jlcpcb.com/partdetail/C2999513
pins: 1, 2
1 alternate drawing of the same symbol

## FRC1210F75R0TS
designator R?  Resistance: 75Ω  (hidden comment: *)
Resistor, 75Ω, ±1%, 333.333mW, 200V, ±100ppm/℃, -55℃~+155℃, SMD 1210; Manufacturer: Uniroyal; Manufacturer Part Number: FRC1210F75R0TS; Supplier 1: LCSC; Supplier Part Number 1: C2960902; JLCPCB Part Number: C2960902; Power Rating: 333.333mW; Category: Resistors; Package Size: 1210; JLCPCB Basic Part: Yes; Tolerance: ±1%; Voltage Rating: 200V; Temperature Coefficient: ±100ppm/℃; Temperature Rating: -55℃~+155℃; ComponentLink1Description: Datasheet; ComponentLink1URL: https://wmsc.lcsc.com/wmsc/upload/file/pdf/v2/lcsc/2308241947_FOJAN-FRC1210F75R0TS_C2960902.pdf; ComponentLink2Description: JLCPCB Part URL; ComponentLink2URL: https://jlcpcb.com/partdetail/C2960902
pins: 1, 2
1 alternate drawing of the same symbol

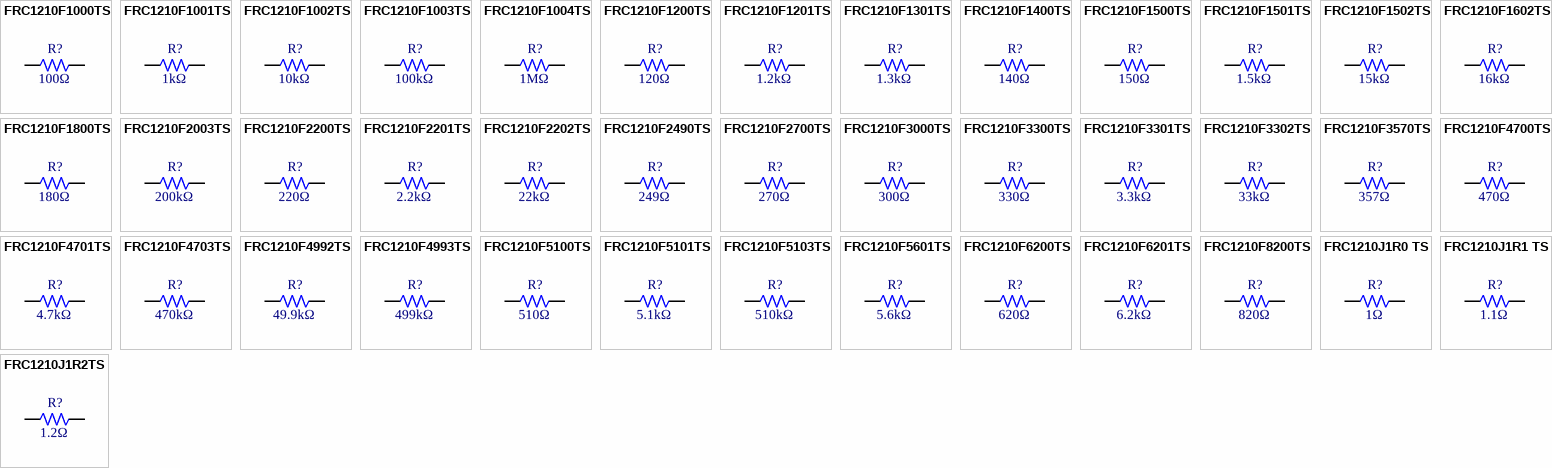
[diagram p41: symbols FRC1210F1000TS to FRC1210J1R2TS]

## FRC1210F1000TS
designator R?  Resistance: 100Ω  (hidden comment: *)
Resistor, 100Ω, ±1%, 333.333mW, 200V, ±100ppm/℃, -55℃~+155℃, SMD 1210; Manufacturer: Uniroyal; Manufacturer Part Number: FRC1210F1000TS; Supplier 1: LCSC; Supplier Part Number 1: C2933799; JLCPCB Part Number: C2933799; Power Rating: 333.333mW; Category: Resistors; Package Size: 1210; JLCPCB Basic Part: Yes; Tolerance: ±1%; Voltage Rating: 200V; Temperature Coefficient: ±100ppm/℃; Temperature Rating: -55℃~+155℃; ComponentLink1Description: Datasheet; ComponentLink1URL: https://wmsc.lcsc.com/wmsc/upload/file/pdf/v2/lcsc/2308241115_FOJAN-FRC1210F1000TS_C2933799.pdf; ComponentLink2Description: JLCPCB Part URL; ComponentLink2URL: https://jlcpcb.com/partdetail/C2933799
pins: 1, 2
1 alternate drawing of the same symbol

## FRC1210F1001TS
designator R?  Resistance: 1kΩ  (hidden comment: *)
Resistor, 1kΩ, ±1%, 333.333mW, 200V, ±100ppm/℃, -55℃~+155℃, SMD 1210; Manufacturer: Uniroyal; Manufacturer Part Number: FRC1210F1001TS; Supplier 1: LCSC; Supplier Part Number 1: C2960861; JLCPCB Part Number: C2960861; Power Rating: 333.333mW; Category: Resistors; Package Size: 1210; JLCPCB Basic Part: Yes; Tolerance: ±1%; Voltage Rating: 200V; Temperature Coefficient: ±100ppm/℃; Temperature Rating: -55℃~+155℃; ComponentLink1Description: Datasheet; ComponentLink1URL: https://wmsc.lcsc.com/wmsc/upload/file/pdf/v2/lcsc/2308241947_FOJAN-FRC1210F1001TS_C2960861.pdf; ComponentLink2Description: JLCPCB Part URL; ComponentLink2URL: https://jlcpcb.com/partdetail/C2960861
pins: 1, 2
1 alternate drawing of the same symbol

## FRC1210F1002TS
designator R?  Resistance: 10kΩ  (hidden comment: *)
Resistor, 10kΩ, ±1%, 333.333mW, 200V, ±100ppm/℃, -55℃~+155℃, SMD 1210; Manufacturer: Uniroyal; Manufacturer Part Number: FRC1210F1002TS; Supplier 1: LCSC; Supplier Part Number 1: C2974059; JLCPCB Part Number: C2974059; Power Rating: 333.333mW; Category: Resistors; Package Size: 1210; JLCPCB Basic Part: Yes; Tolerance: ±1%; Voltage Rating: 200V; Temperature Coefficient: ±100ppm/℃; Temperature Rating: -55℃~+155℃; ComponentLink1Description: Datasheet; ComponentLink1URL: https://wmsc.lcsc.com/wmsc/upload/file/pdf/v2/lcsc/2202151130_FOJAN-FRC1210F1002TS_C2974059.pdf; ComponentLink2Description: JLCPCB Part URL; ComponentLink2URL: https://jlcpcb.com/partdetail/C2974059
pins: 1, 2
1 alternate drawing of the same symbol

## FRC1210F1003TS
designator R?  Resistance: 100kΩ  (hidden comment: *)
Resistor, 100kΩ, ±1%, 333.333mW, 200V, ±100ppm/℃, -55℃~+155℃, SMD 1210; Manufacturer: Uniroyal; Manufacturer Part Number: FRC1210F1003TS; Supplier 1: LCSC; Supplier Part Number 1: C2933800; JLCPCB Part Number: C2933800; Power Rating: 333.333mW; Category: Resistors; Package Size: 1210; JLCPCB Basic Part: Yes; Tolerance: ±1%; Voltage Rating: 200V; Temperature Coefficient: ±100ppm/℃; Temperature Rating: -55℃~+155℃; ComponentLink1Description: Datasheet; ComponentLink1URL: https://wmsc.lcsc.com/wmsc/upload/file/pdf/v2/lcsc/2308241115_FOJAN-FRC1210F1003TS_C2933800.pdf; ComponentLink2Description: JLCPCB Part URL; ComponentLink2URL: https://jlcpcb.com/partdetail/C2933800
pins: 1, 2
1 alternate drawing of the same symbol

## FRC1210F1004TS
designator R?  Resistance: 1MΩ  (hidden comment: *)
Resistor, 1MΩ, ±1%, 333.333mW, 200V, ±100ppm/℃, -55℃~+155℃, SMD 1210; Manufacturer: Uniroyal; Manufacturer Part Number: FRC1210F1004TS; Supplier 1: LCSC; Supplier Part Number 1: C2933801; JLCPCB Part Number: C2933801; Power Rating: 333.333mW; Category: Resistors; Package Size: 1210; JLCPCB Basic Part: Yes; Tolerance: ±1%; Voltage Rating: 200V; Temperature Coefficient: ±100ppm/℃; Temperature Rating: -55℃~+155℃; ComponentLink1Description: Datasheet; ComponentLink1URL: https://wmsc.lcsc.com/wmsc/upload/file/pdf/v2/lcsc/2308241115_FOJAN-FRC1210F1004TS_C2933801.pdf; ComponentLink2Description: JLCPCB Part URL; ComponentLink2URL: https://jlcpcb.com/partdetail/C2933801
pins: 1, 2
1 alternate drawing of the same symbol

## FRC1210F1200TS
designator R?  Resistance: 120Ω  (hidden comment: *)
Resistor, 120Ω, ±1%, 333.333mW, 200V, ±100ppm/℃, -55℃~+155℃, SMD 1210; Manufacturer: Uniroyal; Manufacturer Part Number: FRC1210F1200TS; Supplier 1: LCSC; Supplier Part Number 1: C2974062; JLCPCB Part Number: C2974062; Power Rating: 333.333mW; Category: Resistors; Package Size: 1210; JLCPCB Basic Part: Yes; Tolerance: ±1%; Voltage Rating: 200V; Temperature Coefficient: ±100ppm/℃; Temperature Rating: -55℃~+155℃; ComponentLink1Description: Datasheet; ComponentLink1URL: https://wmsc.lcsc.com/wmsc/upload/file/pdf/v2/lcsc/2202151130_FOJAN-FRC1210F1200TS_C2974062.pdf; ComponentLink2Description: JLCPCB Part URL; ComponentLink2URL: https://jlcpcb.com/partdetail/C2974062
pins: 1, 2
1 alternate drawing of the same symbol
